# Altium footprint library 2-Pcblib_Cap.PcbLib: 73 footprints (part 4 of 5)
Each footprint in its own frame and in the unit in brackets; x right, y up, seen from the top. Pads: shape width x height; smd on the part's side, far side on the other; paste and mask are expansions set on the pad; w line width, h text height; cw(c..) or ccw(c..) is an arc to the next point about the centre after c.
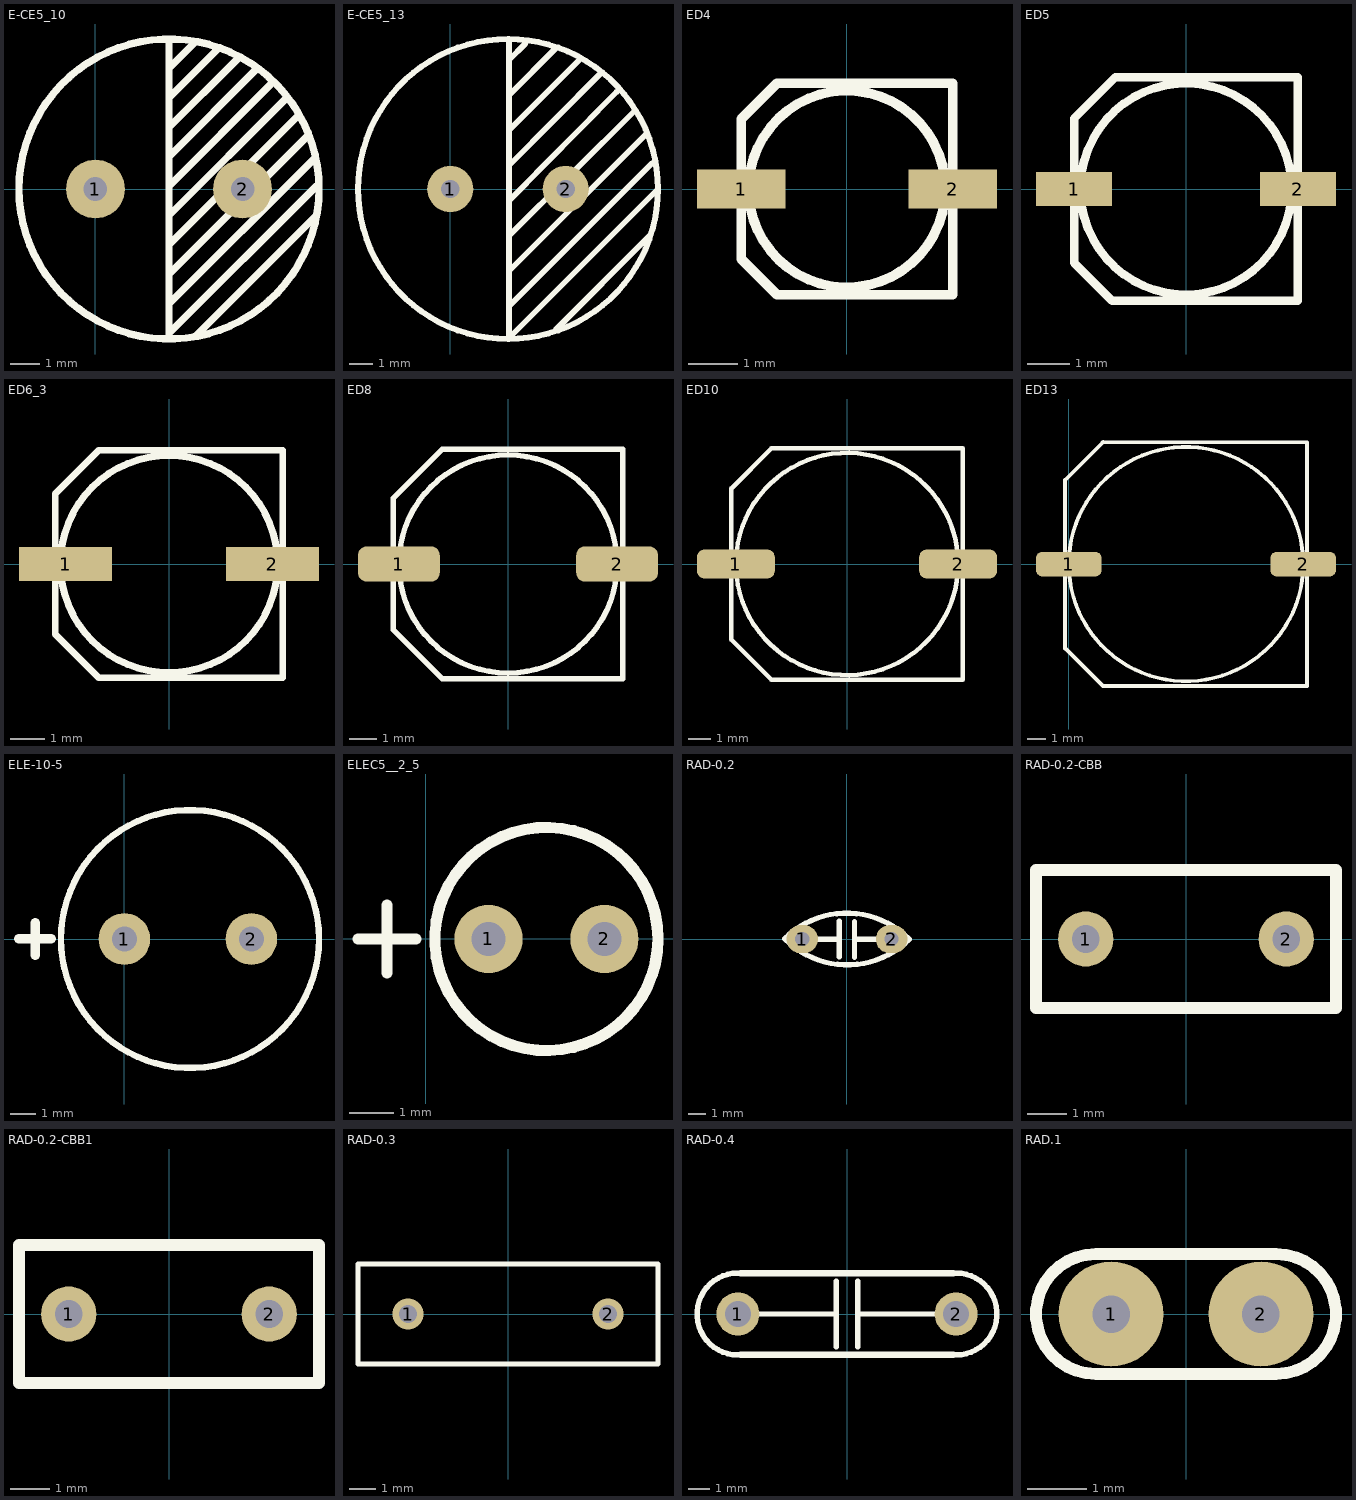
[diagram p3: the footprints below, top view; thin cyan lines are the x and y axes]

## E-CE5_10 [mm]
height 0.6
pads (2):
  round 2 hole 0.8: 1(0,0) 2(5,0)
Top Overlay:
  circle w0.254: c2.5,0 r5.1
  lines w0.254: 2.5,-5.1 2.5,5.1 ; 2.5,-4.9 7.5,0.1 ; 2.5,-3.9 7.4,1 ; 2.5,-2.9 7.2,1.8 ; 2.5,-1.9 6.9,2.5 ; 2.5,-0.9 6.5,3.1 ; 2.5,0.1 6,3.6 ; 2.5,1.1 5.5,4.1 ; 2.5,2.1 4.8,4.4 ; 2.5,3.1 4.2,4.8 ; 2.5,4.1 3.4,5 ; 3.4,-5 7.5,-0.9
3D body: height 16.53, standoff -3.74, extent -2.485,-5.152 7.565,4.898

## E-CE5_13 [mm]
height 0.6
pads (2):
  round 2 hole 0.8: 1(0,0) 2(5,0)
Top Overlay:
  circle w0.254: c2.5,0 r6.5
  lines w0.254: 2.54,-5.08 8.736,1.116 ; 2.54,-3.556 8.5,2.4 ; 2.54,-2.032 8,3.4 ; 2.54,-0.508 7.2,4.2 ; 2.54,1.016 6.5,5 ; 2.54,2.54 5.588,5.588 ; 2.54,4.064 4.572,6.096 ; 2.54,5.588 3.248,6.296 ; 2.54,6.5 2.54,-6.5 2.54,-6.46 9,0 ; 4.572,-6.096 8.636,-2.032
3D body: height 25.4, standoff -28.75, extent -4.056,-6.858 9.144,6.342

## ED4 [mm]
height 5.5
pads (2):
  rect 1.8x0.8 smd: 1(-2.15,0) 2(2.15,0)
Top Overlay:
  circle w0.2: c0,0 r2
  lines w0.2: -1.433,-2.139 -2.15,-1.422 ; -1.433,2.139 -2.15,1.422 ; -2.15,-1.422 -2.15,1.422 ; -2.15,-1.422 -1.422,-2.15 2.15,-2.15 2.15,2.15 -1.422,2.15 -2.15,1.422
3D body: height 5.2, standoff 0, extent -2.286,-2.159 2.314,2.141

## ED5 [mm]
height 5.5
pads (2):
  rect 1.8x0.8 smd: 1(-2.65,0) 2(2.65,0)
Top Overlay:
  circle w0.2: c0,0 r2.5
  lines w0.2: -2.65,-1.744 -2.65,1.668 -1.668,2.65 2.65,2.65 2.65,-2.65 -1.744,-2.65 -2.65,-1.744
3D body: height 5.2, standoff 0, extent -2.8,-2.667 2.8,2.633

## ED6_3 [mm]
height 5.5
pads (2):
  rect 2.7x1 smd: 1(-3,0) 2(3,0)
Top Overlay:
  circle w0.2: c0,0 r3.15
  lines w0.2: -3.3,2.032 -3.3,-2.032 -2.032,-3.3 3.3,-3.3 3.3,3.3 -2.032,3.3 -3.287,2.045
3D body: height 5.2, standoff 0, extent -3.5,-3.302 3.5,3.298

## ED8 [mm]
height 10
pads (2):
  rrect50% 3x1.3 smd: 1(-4,0) 2(4,0)
Top Overlay:
  circle w0.2: c0,0 r4
  lines w0.2: -4.2,-2.413 -2.413,-4.2 4.2,-4.2 4.2,4.2 -2.413,4.2 -4.2,2.413 -4.2,-2.413
3D body: height 10.5, standoff 0, extent -4.521,-4.216 4.479,4.084

## ED10 [mm]
height 10
pads (2):
  rrect50% 3.5x1.3 smd: 1(-5,0) 2(5,0)
Top Overlay:
  circle w0.2: c0,0 r5
  lines w0.2: -5.2,3.404 -5.2,-3.404 -3.404,-5.2 5.2,-5.2 5.2,5.2 -3.404,5.2 -5.191,3.413
3D body: height 10.21, standoff -0.01, extent -5.775,-5.118 5.825,5.182

## ED13 [mm]
height 10
pads (2):
  rrect50% 3.5x1.3 smd: 1(0,0) 2(12.5,0)
Top Overlay:
  circle w0.2: c6.25,0 r6.25
  lines w0.1: -0.2,-4.5 -0.174,-4.5 ; -0.2,4.5 -0.174,4.5
  lines w0.2: -0.2,-4.5 -0.2,4.5 ; -0.174,-4.5 1.803,-6.477 ; -0.174,4.5 1.841,6.515 ; 1.8,6.5 12.7,6.5 12.7,-6.5 1.803,-6.5
3D body: height 16.45, standoff 0.1, extent -0.838,-6.472 13.462,6.528

## ELE-10-5 [mil]
pads (2):
  round 80 hole 39: 1(0,0) 2(196.85,0)
Top Overlay:
  circle w10: c101.71,0 r200
  lines w15: -163.39,0.17 -113.39,0.17 ; -138.39,-24.83 -138.39,25.17

## ELEC5__2_5 [mil]
height 23.62
pads (2):
  round 60 hole 30: 1(55.28,0) 2(157.32,0)
Top Overlay:
  circle w10: c106.3,0 r98.16
  lines w10: -59.53,0 -8.5,0 ; -34.02,-29.76 -34.02,29.76
3D body: height 453.76, standoff -128.81, extent 5.58,-99.42 204.43,99.43

## RAD-0.2 [mm]
pads (2):
  oval 1.8x1.6 hole 0.8: 1(-2.54,0) 2(2.54,0)
Top Overlay:
  lines w0.3: -3.548,0.02 cw(c-0.012,-3.516) 3.523,0.02 ; -3.515,0 ccw(c0.02,3.536) 3.556,0 ; -2.54,0 -0.508,0 ; -0.432,-1.016 -0.432,1.016 ; 0.436,-1.041 0.436,0.991 ; 0.436,0 2.54,0
Bottom Overlay:
  lines w0.3: -1.524,0 -0.508,0 ; -0.432,-1.016 -0.432,1.016 ; 0.436,-1.041 0.436,0.991 ; 0.436,0 1.49,0
3D body: height 4.16, standoff -9.03, extent -4.026,-1.173 3.975,1.219

## RAD-0.2-CBB [mm]
pads (2):
  round 1.4 hole 0.7: 1(-2.54,0) 2(2.54,0)
Top Overlay:
  lines w0.305: -3.8,-1.75 -3.8,1.75 3.8,1.75 3.8,-1.75 -3.8,-1.75
3D body: height 8.11, standoff -4.09, extent -3.699,-1.245 3.801,1.255

## RAD-0.2-CBB1 [mm]
pads (2):
  round 1.4 hole 0.7: 1(-2.54,0) 2(2.54,0)
Top Overlay:
  lines w0.305: -3.8,-1.75 3.8,-1.75 3.8,1.75 -3.8,1.75 -3.8,-1.75
3D body: height 1.5, standoff -7.5, extent -3.6,-1.219 3.6,1.281

## RAD-0.3 [mm] "Capacitor; 2 Leads"
height 6
pads (2):
  round 1.2 hole 0.7: 1(-3.81,0) 2(3.81,0)
Top Overlay:
  lines w0.2: -5.715,-1.905 -5.715,1.905 5.715,1.905 5.715,-1.905 -5.715,-1.905
3D body: height 10.03, standoff -3.16, extent -3.975,-1.22 4.026,1.168

## RAD-0.4 [mm]
pads (2):
  round 2 hole 1.2: 1(-5.08,0) 2(5.08,0)
Top Overlay:
  lines w0.254: -5.08,-1.905 cw(c-5.08,0) -5.08,1.905 ; -4.064,0 -0.508,0 ; -0.508,-1.524 -0.508,1.524 ; 0.508,-1.524 0.508,1.524 ; 0.508,0 4.064,0 ; 5.08,-1.905 ccw(c5.08,0) 5.08,1.905
  lines w0.305: -4.953,-1.905 4.953,-1.905 ; -4.953,1.905 4.953,1.905
3D body: height 17.16, standoff -9.33, extent -9.432,-3.48 9.068,3.32

## RAD.1 [mil]
pads (2):
  round 70 hole 25: 1(-50,0) 2(50,0)
Top Overlay:
  lines w8: -60,-40 cw(c-60,0) -60,40 60,40 cw(c60,0) 60,-40 -60,-40